# Altium footprint library Cty1.PcbLib: 869 footprints (part 34 of 55)
Each footprint in its own frame and in the unit in brackets; x right, y up, seen from the top. Pads: shape width x height; smd on the part's side, far side on the other; paste and mask are expansions set on the pad; w line width, h text height; cw(c..) or ccw(c..) is an arc to the next point about the centre after c.
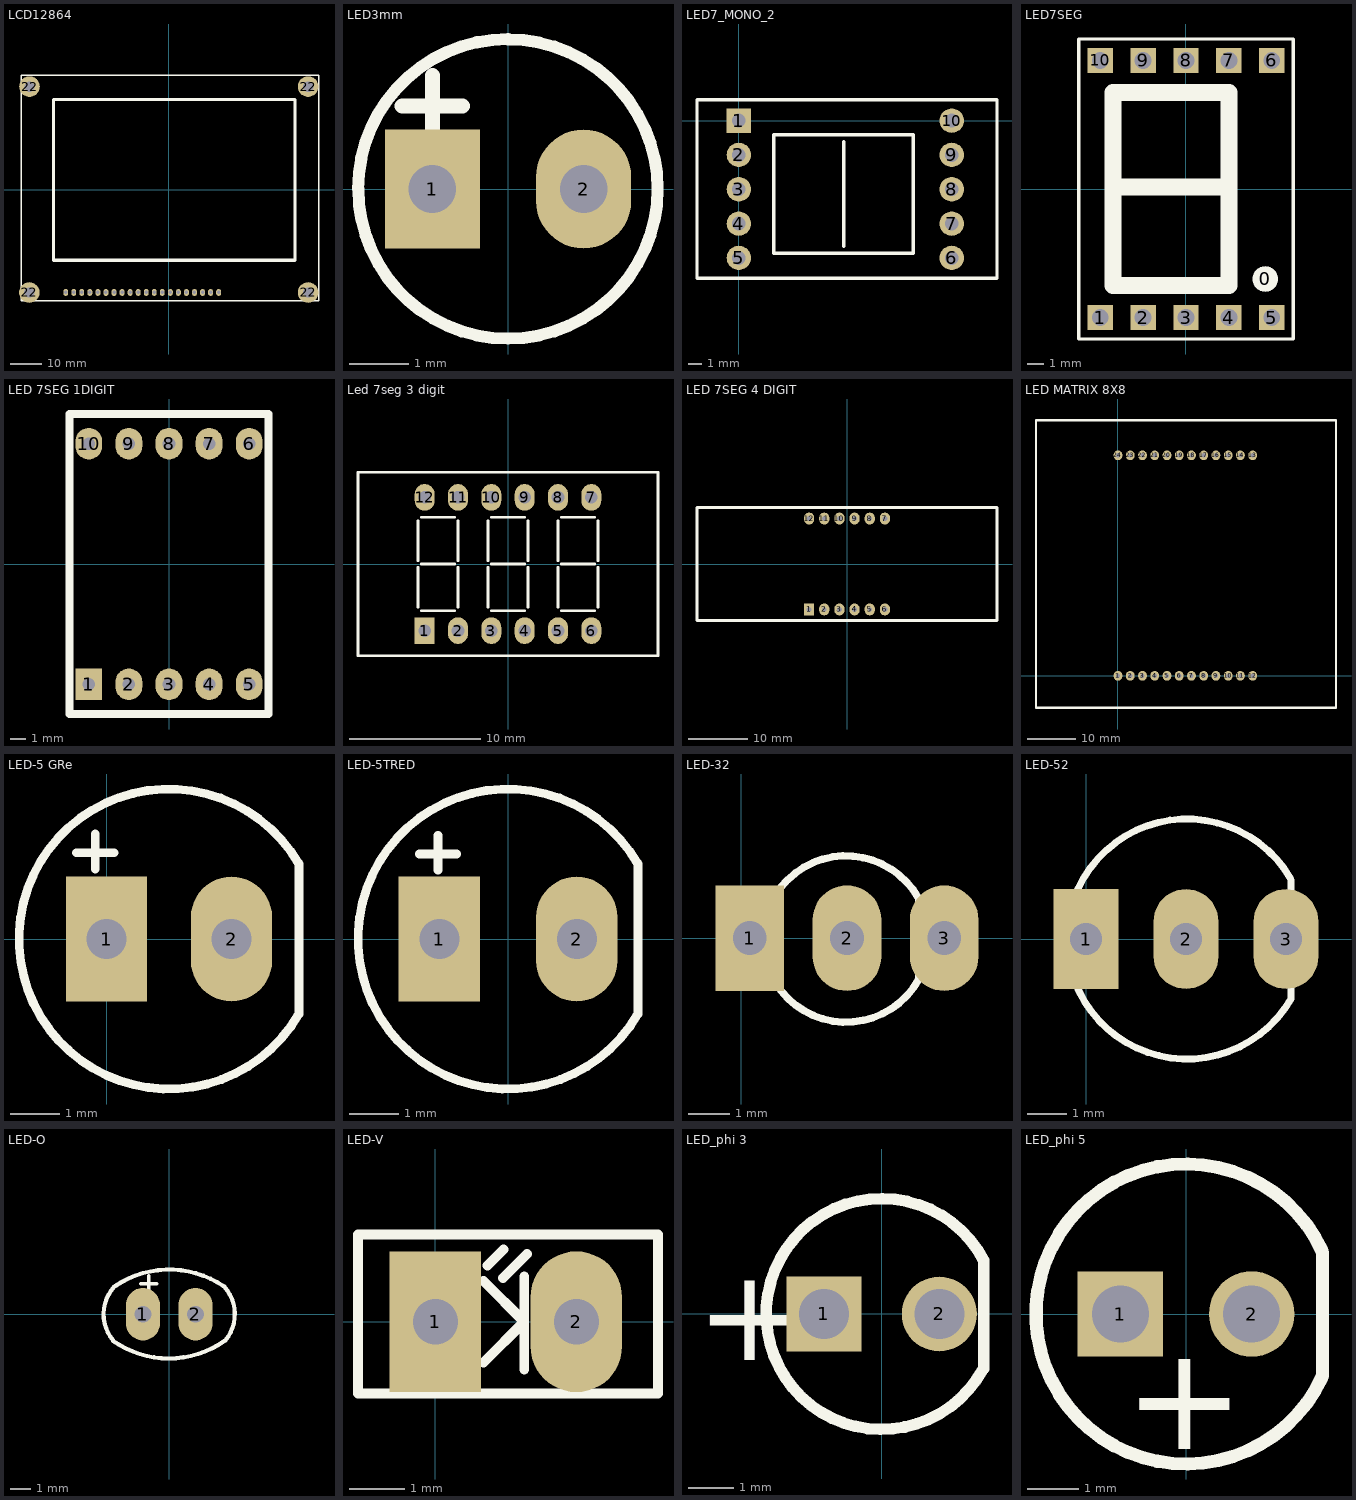
[diagram p33: the footprints below, top view; thin cyan lines are the x and y axes]

## LCD12864 [mm] "LCD12864"
pads (25):
  oval 1.524x2.159 hole 1.1: 1(15.76,-32.5) 1(15.76,-32.5) 2(13.22,-32.5) 3(10.68,-32.5) 4(8.14,-32.5) 5(5.6,-32.5) 6(3.06,-32.5) 7(0.52,-32.5) 8(-2.02,-32.5) 9(-4.56,-32.5) 10(-7.1,-32.5) 11(-9.64,-32.5) 12(-12.18,-32.5) 13(-14.72,-32.5) 14(-17.26,-32.5) 15(-19.8,-32.5) 16(-22.34,-32.5) 17(-24.88,-32.5) 18(-27.42,-32.5) 19(-29.96,-32.5) 20(-32.5,-32.5)
  round 6.5 hole 3.3: 22(-44,-32.5) 22(-43.93,32.5) 22(44,-32.5) 22(44,32.5)
Top Overlay:
  lines w0.45: -46.54,-35.04 47.44,-35.04 47.44,36.08 -46.54,36.08 -46.54,-35.04
  lines w1: -36.38,-22.34 -36.38,28.46 39.82,28.46 39.82,-22.34 -36.38,-22.34

## LED3mm [mm]
pads (2):
  rect 1.6x2 hole 0.8: 1(-1.27,0)
  oval 1.6x2 hole 0.8: 2(1.27,0)
Top Overlay:
  lines w0.203: -2.521,0 cw(c0,0) 0,2.521 ; -2.514,0 ccw(c0,0) 0,-2.514 ccw(c0,0) 2.514,0 ccw(c0,0) 0,2.514
  lines w0.254: -1.778,1.397 -0.762,1.397 ; -1.27,0.889 -1.27,1.905
3D body "SW3DPS-REDLED-DIP.step": height 5.38, standoff -3.17, extent -1.992,-1.499 1.992,1.994

## LED7_MONO_2 [mm]
pads (10):
  rect 1.778x1.778 hole 1 unplated: 1(0,0)
  round 1.778 hole 1 unplated: 2(0,-2.5) 3(0,-5) 4(0,-7.5) 5(0,-10) 6(15.5,-10) 7(15.5,-7.5) 8(15.5,-5) 9(15.5,-2.5) 10(15.5,0)
Top Overlay:
  lines w0.2: -3.048,-11.484 -3.048,1.016 ; 18.796,-11.484 18.796,1.016
  lines w0.254: -3.048,-11.484 18.796,-11.484 ; -3.048,1.016 -3.048,1.524 18.796,1.524 18.796,1.016 ; 7.62,-9.144 7.62,-8.636 7.62,-1.524 ; 2.54,-9.652 2.54,-1.016 12.7,-1.016 12.7,-9.652 2.54,-9.652

## LED7SEG [mm] "LED7SEG"
pads (11):
  round 1.524 on Top Overlay: 0(4.724,-5.334)
  rect 1.5x1.5 hole 1: 1(-5.055,-7.62) 2(-2.515,-7.62) 3(0.025,-7.62) 4(2.565,-7.62) 5(5.105,-7.62) 6(5.105,7.62) 7(2.565,7.62) 8(0.025,7.62) 9(-2.515,7.62) 10(-5.055,7.62)
Top Overlay:
  lines w0.2: -6.325,-8.89 6.375,-8.89 6.375,8.89 -6.325,8.89 -6.325,-8.89
  lines w1: -4.166,0.127 2.565,0.127 ; -4.293,-5.715 -4.293,5.715 2.565,5.715 2.565,-5.715 -4.293,-5.715
3D body "SW3DPS-7SEGMENT DISPLAY.STEP": height 8.03, standoff -3.97, extent -6.35,-9.525 6.35,9.525

## LED 7SEG 1DIGIT [mm] "LED 7SEG 1DIGIT"
height 7.62
pads (10):
  rect 1.7x2 hole 0.8: 1(-5.08,-7.62)
  oval 1.7x2 hole 0.8: 2(-2.54,-7.62) 3(0,-7.62) 4(2.54,-7.62) 5(5.08,-7.62) 6(5.08,7.62) 7(2.54,7.62) 8(0,7.62) 9(-2.54,7.62) 10(-5.08,7.62)
Top Overlay:
  lines w0.5: -6.3,-9.5 6.3,-9.5 6.3,9.5 -6.3,9.5 -6.3,-9.5
3D body: height 8, standoff 0, extent -6.325,-9.576 6.274,9.423

## Led 7seg 3 digit [mil] "DIP; 14 Leads (2 Absent); Row Spacing 7.62 mm; Pitch 2.54 mm"
height 165.35
pads (12):
  rect 60x80 hole 38: 1(-250,-200)
  oval 60x80 hole 38: 2(-150,-200) 3(-50,-200) 4(50,-200) 5(150,-200) 6(250,-200) 7(250,200) 8(150,200) 9(50,200) 10(-50,200) 11(-150,200) 12(-250,200)
Top Overlay:
  lines w8: -270,-130 -270,-10 ; -270,10 -270,130 ; -260,-140 -160,-140 ; -260,0 -160,0 ; -260,140 -160,140 ; -150,-130 -150,-10 ; -150,10 -150,130 ; -60,-130 -60,-10 ; -60,10 -60,130 ; -50,-140 50,-140 ; -50,0 50,0 ; -50,140 50,140 ; 60,-130 60,-10 ; 60,10 60,130 ; 150,-130 150,-10 ; 150,10 150,130 ; 160,-140 260,-140 ; 160,0 260,0 ; 160,140 260,140 ; 270,-130 270,-10 ; 270,10 270,130 ; -450,-275 -450,275 450,275 450,-275 -450,-275

## LED 7SEG 4 DIGIT [mm] "LED 7SEG 4DIGIT"
height 7.62
pads (12):
  rect 1.7x2 hole 0.8: 1(-6.35,-7.62)
  oval 1.7x2 hole 0.8: 2(-3.81,-7.62) 3(-1.27,-7.62) 4(1.27,-7.62) 5(3.81,-7.62) 6(6.35,-7.62) 7(6.35,7.62) 8(3.81,7.62) 9(1.27,7.62) 10(-1.27,7.62) 11(-3.81,7.62) 12(-6.35,7.62)
Top Overlay:
  lines w0.5: -25.15,-9.5 -25.15,9.5 25.15,9.5 25.15,-9.5 -25.15,-9.5
3D body: height 8, standoff 0, extent -25.121,-9.5 25.121,9.474

## LED MATRIX 8X8 [mm]
pads (24):
  oval 1.8x2 hole 0.9: 1(0,0) 2(2.54,0) 3(5.08,0) 4(7.62,0) 5(10.16,0) 6(12.7,0) 7(15.24,0) 8(17.78,0) 9(20.32,0) 10(22.86,0) 11(25.4,0) 12(27.94,0) 13(27.94,45.72) 14(25.4,45.72) 15(22.86,45.72) 16(20.32,45.72) 17(17.78,45.72) 18(15.24,45.72) 19(12.7,45.72) 20(10.16,45.72) 21(7.62,45.72) 22(5.08,45.72) 23(2.54,45.72) 24(0,45.72)
Top Overlay:
  lines w0.5: -17.006,-6.65 45.224,-6.65 45.224,53.04 -2.401,53.04 -17.006,53.04 -17.006,-6.65

## LED-5 GRe [mil] "LED 2 PIN, 5 ly , Only colour,pin to pin 100mil"
height 300
pads (2):
  rect 65x100 hole 32: 1(0,0)
  oval 65x100 hole 32: 2(100,0)
Top Overlay:
  lines w7: -24,69 6,69 ; -9,56 -9,84 ; 153.51,60.71 ccw(c50,0) 153.94,-59.97 ; 154,-59 154,60
3D body "SW3dPS-LED green.STEP": height 336.82, standoff -117.51, extent -54.33,-103.65 154.33,105.01

## LED-5TRED [mil] "LED 2 PIN, 5 ly , Only colour, pin to pin 110mil"
height 300
pads (2):
  rect 65x100 hole 32: 1(-55,0)
  oval 65x100 hole 32: 2(55,0)
Top Overlay:
  lines w7: -71,68 -41,68 ; -56,55 -56,83 ; 103.51,60.71 ccw(c0,0) 103.94,-59.97 ; 104,-59 104,60
3D body "SW3dPS-LEDd5R.STEP": height 339.18, standoff -243.49, extent -115.69,-117 97.7,120

## LED-32 [mil] "LED 3 PIN, 3ly Two colour"
height 300
pads (3):
  rect 65x100 hole 32: 1(8,0)
  oval 65x100 hole 32: 2(100,0) 3(192,0)
Top Overlay:
  lines w7: 168,-39 168,37
  lines w7.01: 167.87,37.48 ccw(c99.08,-0.84) 167.97,-38.98

## LED-52 [mil] "LED 3 PIN, 5 ly , Two colour"
height 300
pads (3):
  rect 65x100 hole 32: 1(0,0)
  oval 65x100 hole 32: 2(100,0) 3(200,0)
Top Overlay:
  lines w7: 204.51,60.71 ccw(c101,0) 204.94,-59.97 ; 205,-59 205,59

## LED-O [mil] "LED 2 PIN,  Ovan Only colour, pin to pin 110mil"
height 300
pads (2):
  oval 65x100 hole 32: 1(-50,0) 2(50,0)
Top Overlay:
  lines w7: -54,58 -24,58 ; -39,43 -39,73
  lines w8: -106.82,-49.85 cw(c-47,0) -104.5,52.5 ; -106.38,-51.11 ccw(c-0.81,100.81) 104.97,-50.96 ; -102.83,53.79 cw(c0,-100) 103.93,53.04 ; 104.5,52.5 cw(c47,0) 106.82,-49.85

## LED-V [mil] "LED 2 PIN, Rectang Only colour"
height 300
pads (2):
  rect 65x100 hole 32: 1(0,0)
  oval 65x100 hole 32: 2(100,0)
Top Overlay:
  lines w7: 34,-29 63,0 34,29 ; 37,40 48.3,51.3 ; 48,31 65,48 ; 63,-34 63,32 ; -55,-51 -55,62 158,62 158,-51 -55,-51

## LED_phi 3 [mil] "LED phi 3"
height 236.22
pads (2):
  rect 65x65 hole 43.31: 1(-50,0)
  round 65 hole 43.31: 2(50,0)
Top Overlay:
  lines w10: 87.62,-48.19 cw(c0,0) 88.49,46.58 88.49,-47.32
  text "+" at -160,-40 h80

## LED_phi 5 [mil] "LED phi 5mm"
height 649.61
pads (2):
  rect 65x65 hole 43.31: 1(-50,0)
  round 65 hole 43.31: 2(50,0)
Top Overlay:
  lines w10: 103.49,-48.23 cw(c0,0) 103.49,48.23 ; 104,-47 104,46.9
  text "+" at -47,-103 h80